# Altium footprint library nccpcblib.PcbLib: 63 footprints (part 2 of 4)
Each footprint in its own frame and in the unit in brackets; x right, y up, seen from the top. Pads: shape width x height; smd on the part's side, far side on the other; paste and mask are expansions set on the pad; w line width, h text height; cw(c..) or ccw(c..) is an arc to the next point about the centre after c.
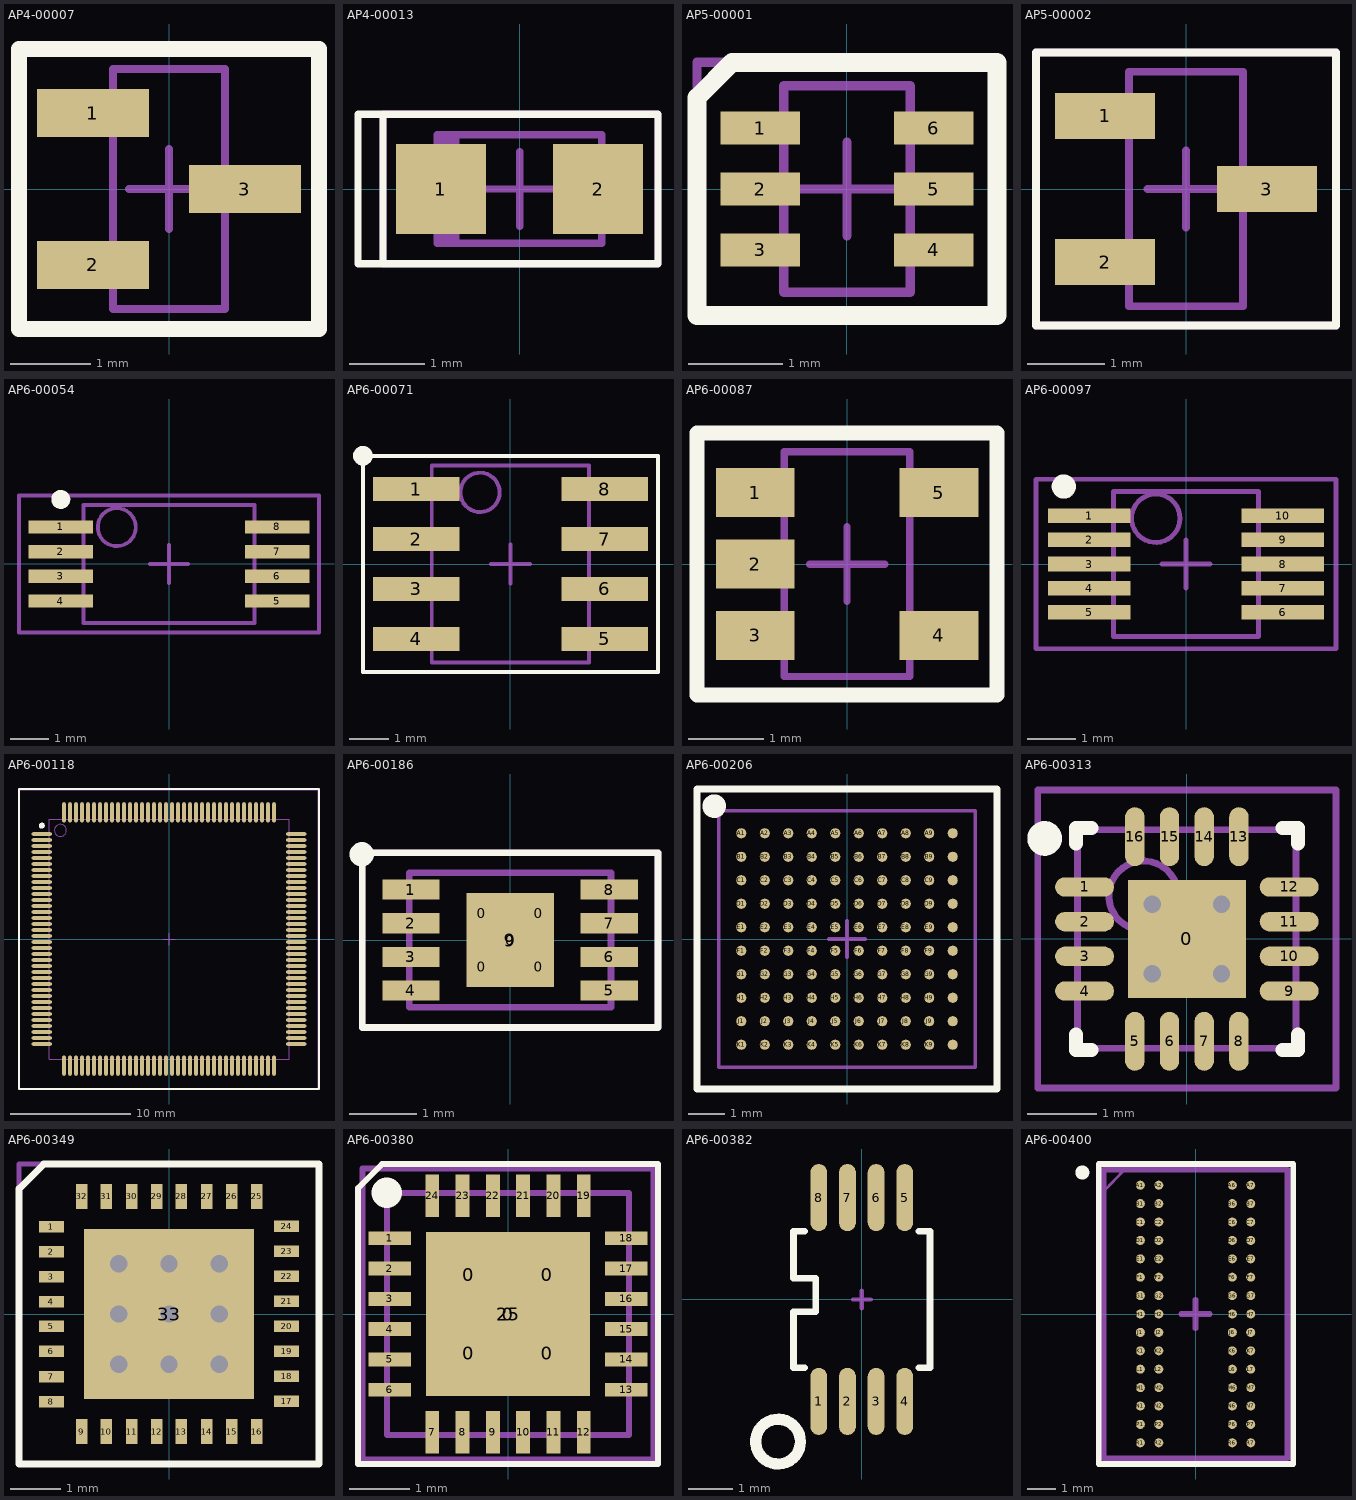
[diagram p1: the footprints below, top view; thin cyan lines are the x and y axes]

## AP4-00007 [mm]
height 1.1
pads (3):
  rect 1.4x0.6 smd: 1(-0.95,0.95) 2(-0.95,-0.95) 3(0.95,0)
Top Overlay:
  lines w0.2: -1.875,-1.75 1.875,-1.75 1.875,1.75 -1.875,1.75 -1.875,-1.75
Mechanical 13:
  lines w0.1: -0.7,-1.5 -0.7,1.5 0.7,1.5 0.7,-1.5 -0.7,-1.5
Mechanical 15:
  lines w0.1: -0.5,0 0.5,0 ; 0,-0.5 0,0.5 ; -1.875,-1.75 1.875,-1.75 1.875,1.75 -1.875,1.75 -1.875,-1.75
3D body: height 1.07, standoff -0.03, extent -1.25,-1.5 1.25,1.5

## AP4-00013 [mm] "0805 diode footprint"
height 1.1
pads (2):
  rect 1.2x1.2 smd: 1(-1.05,0) 2(1.05,0)
Top Overlay:
  lines w0.1: -1.762,1 -2.159,1 -2.159,-1 -1.794,-1 ; -1.794,-1 -1.825,-0.969 -1.825,1 1.85,1 1.85,-1 -1.794,-1
Mechanical 13:
  rectangle: -1.1,-0.725 -0.804,0.725
  lines w0.1: -1.1,-0.725 -1.1,0.725 1.1,0.725 1.1,-0.725 -1.1,-0.725
Mechanical 15:
  lines w0.1: -0.5,0 0.5,0 ; 0,-0.5 0,0.5 ; -1.825,-1 -1.825,1 1.85,1 1.85,-1 -1.825,-1
3D body: height 0.6, standoff 0, extent -0.85,-0.625 0.85,0.625
3D body: height 1.1, standoff 0.6, extent -0.7,-0.625 0.7,0.625
3D body: height 0.61, standoff 0, extent -1,-0.625 -0.85,0.625
3D body: height 0.61, standoff 0, extent 0.85,-0.625 1,0.625
3D body: height 0.61, standoff 0.6, extent -0.7,-0.1 0.7,0.1
3D body: height 0.61, standoff 0.6, extent -0.675,-0.6 -0.525,-0.45
3D body: height 0.61, standoff 0.6, extent -0.675,0.45 -0.525,0.6
3D body: height 0.65, standoff 0.6, extent -0.425,-0.05 -0.325,0.05

## AP5-00001 [mm]
height 1.1
pads (6):
  rect 0.85x0.35 smd: 1(-0.925,0.65) 2(-0.925,0) 3(-0.925,-0.65) 4(0.925,-0.65) 5(0.925,0) 6(0.925,0.65)
Top Overlay:
  lines w0.2: -1.6,-1.35 -1.6,0.975 -1.225,1.35 1.6,1.35 1.6,-1.35 -1.6,-1.35
Mechanical 13:
  lines w0.1: -0.675,-1.1 0.675,-1.1 0.675,1.1 -0.675,1.1 -0.675,-1.1
Mechanical 15:
  lines w0.1: -0.5,0 0.5,0 ; 0,-0.5 0,0.5 ; -1.6,-1.35 1.6,-1.35 1.6,1.35 -1.6,1.35 -1.6,-1.35
3D body: height 0.95, standoff -0.04, extent -1.05,-1 1.05,1

## AP5-00002 [mm] "SOT-23 Package"
height 1.1
pads (3):
  rect 1.3x0.6 smd: 1(-1.05,0.95) 2(-1.05,-0.95) 3(1.05,0)
Top Overlay:
  lines w0.1: -1.95,-1.775 1.95,-1.775 1.95,1.775 -1.95,1.775 -1.95,-1.775
Mechanical 13:
  lines w0.1: -0.74,-1.525 -0.74,1.525 0.74,1.525 0.74,-1.525 -0.74,-1.525
Mechanical 15:
  lines w0.1: -0.5,0 0.5,0 ; 0,-0.5 0,0.5 ; -1.95,-1.775 -1.95,1.775 1.95,1.775 1.95,-1.775 -1.95,-1.775
3D body: height 1, standoff -0.02, extent -1.25,-1.46 1.226,1.46

## AP6-00054 [mm]
height 1.2
pads (8):
  rect 1.7x0.35 smd: 1(-2.85,0.975) 2(-2.85,0.325) 3(-2.85,-0.325) 4(-2.85,-0.975) 5(2.85,-0.975) 6(2.85,-0.325) 7(2.85,0.325) 8(2.85,0.975)
Top Overlay:
  circle w0.25: c-2.85,1.7 r0.125
Mechanical 13:
  circle w0.1: c-1.375,0.97 r0.5
  lines w0.1: -2.25,-1.55 2.25,-1.55 2.25,1.55 -2.25,1.55 -2.25,-1.55
Mechanical 15:
  lines w0.1: -0.5,0 0.5,0 ; 0,-0.5 0,0.5 ; -3.95,-1.8 3.95,-1.8 3.95,1.8 -3.95,1.8 -3.95,-1.8
3D body: height 1.25, standoff 0, extent -3.228,-1.55 3.228,1.55

## AP6-00071 [mm]
height 1.75
pads (8):
  rect 2.2x0.6 smd: 1(-2.4,1.905) 2(-2.4,0.635) 3(-2.4,-0.635) 4(-2.4,-1.905) 5(2.4,-1.905) 6(2.4,-0.635) 7(2.4,0.635) 8(2.4,1.905)
Top Overlay:
  circle w0.25: c-3.75,2.75 r0.125
  lines w0.1: -3.75,-2.75 3.75,-2.75 3.75,2.75 -3.75,2.75 -3.75,-2.75
Mechanical 13:
  circle w0.1: c-0.775,1.82 r0.5
  lines w0.1: -2,-2.5 -2,2.5 2,2.5 2,-2.5 -2,-2.5
Mechanical 15:
  lines w0.1: -0.5,0 0.5,0 ; 0,-0.5 0,0.5 ; -3.75,-2.75 -3.75,2.75 3.75,2.75 3.75,-2.75 -3.75,-2.75
3D body: height 1.75, standoff 0, extent -3,-2.45 3,2.45

## AP6-00087 [mm]
height 1.22
pads (5):
  rect 1.05x0.65 smd: 1(-1.225,0.953) 2(-1.225,0) 3(-1.225,-0.953) 4(1.225,-0.953) 5(1.225,0.953)
Top Overlay:
  lines w0.2: -2,-1.75 -2,1.75 2,1.75 2,-1.75 -2,-1.75
Mechanical 13:
  lines w0.1: -0.835,-1.5 0.835,-1.5 0.835,1.5 -0.835,1.5 -0.835,-1.5
Mechanical 15:
  lines w0.1: -0.5,0 0.5,0 ; 0,-0.5 0,0.5 ; -2,-1.75 2,-1.75 2,1.75 -2,1.75 -2,-1.75
3D body: height 1.3, standoff 0, extent -1.5,-1.5 1.5,1.5

## AP6-00097 [mm]
height 1.1
pads (10):
  rect 1.7x0.3 smd: 1(-2,1) 2(-2,0.5) 3(-2,0) 4(-2,-0.5) 5(-2,-1) 6(2,-1) 7(2,-0.5) 8(2,0) 9(2,0.5) 10(2,1)
Top Overlay:
  circle w0.25: c-2.525,1.6 r0.125
Mechanical 13:
  circle w0.1: c-0.625,0.945 r0.5
  lines w0.1: -1.5,-1.5 1.5,-1.5 1.5,1.5 -1.5,1.5 -1.5,-1.5
Mechanical 15:
  lines w0.1: -0.5,0 0.5,0 ; 0,-0.5 0,0.5 ; -3.1,-1.75 3.1,-1.75 3.1,1.75 -3.1,1.75 -3.1,-1.75
3D body: height 1.15, standoff 0, extent -2.45,-1.5 2.45,1.5

## AP6-00118 [mm]
height 1.6
pads (144):
  oval 1.7x0.3 smd: 1(-10.6,8.75) 2(-10.6,8.25) 3(-10.6,7.75) 4(-10.6,7.25) 5(-10.6,6.75) 6(-10.6,6.25) 7(-10.6,5.75) 8(-10.6,5.25) 9(-10.6,4.75) 10(-10.6,4.25) 11(-10.6,3.75) 12(-10.6,3.25) 13(-10.6,2.75) 14(-10.6,2.25) 15(-10.6,1.75) 16(-10.6,1.25) 17(-10.6,0.75) 18(-10.6,0.25) 19(-10.6,-0.25) 20(-10.6,-0.75) 21(-10.6,-1.25) 22(-10.6,-1.75) 23(-10.6,-2.25) 24(-10.6,-2.75) 25(-10.6,-3.25) 26(-10.6,-3.75) 27(-10.6,-4.25) 28(-10.6,-4.75) 29(-10.6,-5.25) 30(-10.6,-5.75) 31(-10.6,-6.25) 32(-10.6,-6.75) 33(-10.6,-7.25) 34(-10.6,-7.75) 35(-10.6,-8.25) 36(-10.6,-8.75) 73(10.6,-8.75) 74(10.6,-8.25) 75(10.6,-7.75) 76(10.6,-7.25) 77(10.6,-6.75) 78(10.6,-6.25) 79(10.6,-5.75) 80(10.6,-5.25) 81(10.6,-4.75) 82(10.6,-4.25) 83(10.6,-3.75) 84(10.6,-3.25) 85(10.6,-2.75) 86(10.6,-2.25) 87(10.6,-1.75) 88(10.6,-1.25) 89(10.6,-0.75) 90(10.6,-0.25) 91(10.6,0.25) 92(10.6,0.75) 93(10.6,1.25) 94(10.6,1.75) 95(10.6,2.25) 96(10.6,2.75) 97(10.6,3.25) 98(10.6,3.75) 99(10.6,4.25) 100(10.6,4.75) 101(10.6,5.25) 102(10.6,5.75) 103(10.6,6.25) 104(10.6,6.75) 105(10.6,7.25) 106(10.6,7.75) 107(10.6,8.25) 108(10.6,8.75)
  oval 0.3x1.7 smd: 37(-8.75,-10.55) 38(-8.25,-10.55) 39(-7.75,-10.55) 40(-7.25,-10.55) 41(-6.75,-10.55) 42(-6.25,-10.55) 43(-5.75,-10.55) 44(-5.25,-10.55) 45(-4.75,-10.55) 46(-4.25,-10.55) 47(-3.75,-10.55) 48(-3.25,-10.55) 49(-2.75,-10.55) 50(-2.25,-10.55) 51(-1.75,-10.55) 52(-1.25,-10.55) 53(-0.75,-10.55) 54(-0.25,-10.55) 55(0.25,-10.55) 56(0.75,-10.55) 57(1.25,-10.55) 58(1.75,-10.55) 59(2.25,-10.55) 60(2.75,-10.55) 61(3.25,-10.55) 62(3.75,-10.55) 63(4.25,-10.55) 64(4.75,-10.55) 65(5.25,-10.55) 66(5.75,-10.55) 67(6.25,-10.55) 68(6.75,-10.55) 69(7.25,-10.55) 70(7.75,-10.55) 71(8.25,-10.55) 72(8.75,-10.55) 109(8.75,10.55) 110(8.25,10.55) 111(7.75,10.55) 112(7.25,10.55) 113(6.75,10.55) 114(6.25,10.55) 115(5.75,10.55) 116(5.25,10.55) 117(4.75,10.55) 118(4.25,10.55) 119(3.75,10.55) 120(3.25,10.55) 121(2.75,10.55) 122(2.25,10.55) 123(1.75,10.55) 124(1.25,10.55) 125(0.75,10.55) 126(0.25,10.55) 127(-0.25,10.55) 128(-0.75,10.55) 129(-1.25,10.55) 130(-1.75,10.55) 131(-2.25,10.55) 132(-2.75,10.55) 133(-3.25,10.55) 134(-3.75,10.55) 135(-4.25,10.55) 136(-4.75,10.55) 137(-5.25,10.55) 138(-5.75,10.55) 139(-6.25,10.55) 140(-6.75,10.55) 141(-7.25,10.55) 142(-7.75,10.55) 143(-8.25,10.55) 144(-8.75,10.55)
Top Overlay:
  circle w0.25: c-10.6,9.45 r0.125
  lines w0.2: -12.5,-12.5 -12.5,12.5 12.5,12.5 12.5,-12.5 -12.5,-12.5
Mechanical 13:
  circle w0.1: c-9.05,9.05 r0.5
  lines w0.1: -10,-10 -10,10 10,10 10,-10 -10,-10
Mechanical 15:
  lines w0.1: -0.5,0 0.5,0 ; 0,-0.5 0,0.5 ; -12.425,-12.425 -12.425,12.425 12.425,12.425 12.425,-12.425 -12.425,-12.425
3D body: height 1.64, standoff -0.01, extent -11,-11 11,11
3D body: height 1.71, standoff 1.5, extent -1.5,5 1.5,7

## AP6-00186 [mm] "8M2, 8-lead 2.0x3.0 mm Body, 0.50 mm Pitch,  WDFN, Very Very Thin, Dual No Lead Package"
height 0.8
pads (14):
  round 0.264 on Top Paste: 0(-0.425,-0.4) 0(-0.425,0.4) 0(0,0) 0(0.425,-0.4) 0(0.425,0.4)
  rect 0.85x0.3 smd: 1(-1.475,0.75) 2(-1.475,0.25) 3(-1.475,-0.25) 4(-1.475,-0.75) 5(1.475,-0.75) 6(1.475,-0.25) 7(1.475,0.25) 8(1.475,0.75)
  rect 1.3x1.4 smd paste-0.7: 9(0,0)
Top Overlay:
  circle w0.25: c-2.206,1.275 r0.056
  lines w0.1: -2.2,-1.3 2.2,-1.3 2.2,1.3 -2.2,1.3 -2.2,-1.3
Mechanical 13:
  lines w0.1: -1.5,-1 1.5,-1 1.5,1 -1.5,1 -1.5,-1
Mechanical 15:
  lines w0.1: -0.5,0 0.5,0 ; 0,-0.5 0,0.5 ; -2.2,-1.3 2.2,-1.3 2.2,1.3 -2.2,1.3 -2.2,-1.3
3D body: height 0.76, standoff 0.74, extent -1.299,0.6 -1.1,0.8
3D body: height 0.2, standoff 0, extent 1.125,-0.875 1.525,-0.625
3D body: height 0.2, standoff 0, extent 1.125,-0.375 1.525,-0.125
3D body: height 0.2, standoff 0, extent 1.125,0.125 1.525,0.375
3D body: height 0.2, standoff 0, extent 1.125,0.625 1.525,0.875
3D body: height 0.2, standoff 0, extent -1.525,-0.875 -1.125,-0.625
3D body: height 0.2, standoff 0, extent -1.525,-0.375 -1.125,-0.125
3D body: height 0.2, standoff 0, extent -1.525,0.125 -1.125,0.375
3D body: height 0.2, standoff 0, extent -1.525,0.625 -1.125,0.875
3D body: height 0.75, standoff 0.05, extent -1.5,-1 1.5,1

## AP6-00206 [mm] "100 ball (10x10 array) VFBGA. Pitch 0.65 mm. Width: 7 mm. Length: 7mm. Height: 1 mm"
height 1
pads (100):
  round 0.28 smd: A1(-2.925,2.925) A2(-2.275,2.925) A3(-1.625,2.925) A4(-0.975,2.925) A5(-0.325,2.925) A6(0.325,2.925) A7(0.975,2.925) A8(1.625,2.925) A9(2.275,2.925) A10(2.925,2.925) B1(-2.925,2.275) B2(-2.275,2.275) B3(-1.625,2.275) B4(-0.975,2.275) B5(-0.325,2.275) B6(0.325,2.275) B7(0.975,2.275) B8(1.625,2.275) B9(2.275,2.275) B10(2.925,2.275) C1(-2.925,1.625) C2(-2.275,1.625) C3(-1.625,1.625) C4(-0.975,1.625) C5(-0.325,1.625) C6(0.325,1.625) C7(0.975,1.625) C8(1.625,1.625) C9(2.275,1.625) C10(2.925,1.625) D1(-2.925,0.975) D2(-2.275,0.975) D3(-1.625,0.975) D4(-0.975,0.975) D5(-0.325,0.975) D6(0.325,0.975) D7(0.975,0.975) D8(1.625,0.975) D9(2.275,0.975) D10(2.925,0.975) E1(-2.925,0.325) E2(-2.275,0.325) E3(-1.625,0.325) E4(-0.975,0.325) E5(-0.325,0.325) E6(0.325,0.325) E7(0.975,0.325) E8(1.625,0.325) E9(2.275,0.325) E10(2.925,0.325) F1(-2.925,-0.325) F2(-2.275,-0.325) F3(-1.625,-0.325) F4(-0.975,-0.325) F5(-0.325,-0.325) F6(0.325,-0.325) F7(0.975,-0.325) F8(1.625,-0.325) F9(2.275,-0.325) F10(2.925,-0.325) G1(-2.925,-0.975) G2(-2.275,-0.975) G3(-1.625,-0.975) G4(-0.975,-0.975) G5(-0.325,-0.975) G6(0.325,-0.975) G7(0.975,-0.975) G8(1.625,-0.975) G9(2.275,-0.975) G10(2.925,-0.975) H1(-2.925,-1.625) H2(-2.275,-1.625) H3(-1.625,-1.625) H4(-0.975,-1.625) H5(-0.325,-1.625) H6(0.325,-1.625) H7(0.975,-1.625) H8(1.625,-1.625) H9(2.275,-1.625) H10(2.925,-1.625) J1(-2.925,-2.275) J2(-2.275,-2.275) J3(-1.625,-2.275) J4(-0.975,-2.275) J5(-0.325,-2.275) J6(0.325,-2.275) J7(0.975,-2.275) J8(1.625,-2.275) J9(2.275,-2.275) J10(2.925,-2.275) K1(-2.925,-2.925) K2(-2.275,-2.925) K3(-1.625,-2.925) K4(-0.975,-2.925) K5(-0.325,-2.925) K6(0.325,-2.925) K7(0.975,-2.925) K8(1.625,-2.925) K9(2.275,-2.925) K10(2.925,-2.925)
Top Overlay:
  circle w0.4: c-3.675,3.675 r0.125
  lines w0.2: -4.15,-4.15 -4.15,4.15 4.15,4.15 4.15,-4.15 -4.15,-4.15
Mechanical 13:
  lines w0.1: -3.55,-3.55 3.55,-3.55 3.55,3.55 -3.55,3.55 -3.55,-3.55
Mechanical 15:
  lines w0.1: -0.5,0 0.5,0 ; 0,-0.5 0,0.5 ; -4.15,-4.15 -4.15,4.15 4.15,4.15 4.15,-4.15 -4.15,-4.15
3D body: height 1, standoff 0.2, extent -3.5,-3.5 3.5,3.5
3D body: height 0.45, standoff 0, extent -2.501,-3.149 -2.051,-2.699
3D body: height 0.45, standoff 0, extent -2.501,-2.499 -2.051,-2.049
3D body: height 0.45, standoff 0, extent -2.501,-1.849 -2.051,-1.399
3D body: height 0.45, standoff 0, extent -2.501,-1.199 -2.051,-0.749
3D body: height 0.45, standoff 0, extent -2.501,-0.549 -2.051,-0.099
3D body: height 0.45, standoff 0, extent -2.501,0.101 -2.051,0.551
3D body: height 0.45, standoff 0, extent -2.501,0.751 -2.051,1.201
3D body: height 0.45, standoff 0, extent -2.501,1.401 -2.051,1.851
3D body: height 0.45, standoff 0, extent -2.501,2.051 -2.051,2.501
3D body: height 0.45, standoff 0, extent -2.501,2.701 -2.051,3.151
3D body: height 0.45, standoff 0, extent -1.851,-3.149 -1.401,-2.699
3D body: height 0.45, standoff 0, extent -1.851,-2.499 -1.401,-2.049
3D body: height 0.45, standoff 0, extent -1.851,-1.849 -1.401,-1.399
3D body: height 0.45, standoff 0, extent -1.851,-1.199 -1.401,-0.749
3D body: height 0.45, standoff 0, extent -1.851,-0.549 -1.401,-0.099
3D body: height 0.45, standoff 0, extent -1.851,0.101 -1.401,0.551
3D body: height 0.45, standoff 0, extent -1.851,0.751 -1.401,1.201
3D body: height 0.45, standoff 0, extent -1.851,1.401 -1.401,1.851
3D body: height 0.45, standoff 0, extent -1.851,2.051 -1.401,2.501
3D body: height 0.45, standoff 0, extent -1.851,2.701 -1.401,3.151
3D body: height 0.45, standoff 0, extent -1.201,-3.149 -0.751,-2.699
3D body: height 0.45, standoff 0, extent -1.201,-2.499 -0.751,-2.049
3D body: height 0.45, standoff 0, extent -1.201,-1.849 -0.751,-1.399
3D body: height 0.45, standoff 0, extent -1.201,-1.199 -0.751,-0.749
3D body: height 0.45, standoff 0, extent -1.201,-0.549 -0.751,-0.099
3D body: height 0.45, standoff 0, extent -1.201,0.101 -0.751,0.551
3D body: height 0.45, standoff 0, extent -1.201,0.751 -0.751,1.201
3D body: height 0.45, standoff 0, extent -1.201,1.401 -0.751,1.851
3D body: height 0.45, standoff 0, extent -1.201,2.051 -0.751,2.501
3D body: height 0.45, standoff 0, extent -1.201,2.701 -0.751,3.151
3D body: height 0.45, standoff 0, extent -0.551,-3.149 -0.101,-2.699
3D body: height 0.45, standoff 0, extent -0.551,-2.499 -0.101,-2.049
3D body: height 0.45, standoff 0, extent -0.551,-1.849 -0.101,-1.399
3D body: height 0.45, standoff 0, extent -0.551,-1.199 -0.101,-0.749
3D body: height 0.45, standoff 0, extent -0.551,-0.549 -0.101,-0.099
3D body: height 0.45, standoff 0, extent -0.551,0.101 -0.101,0.551
3D body: height 0.45, standoff 0, extent -0.551,0.751 -0.101,1.201
3D body: height 0.45, standoff 0, extent -0.551,1.401 -0.101,1.851
3D body: height 0.45, standoff 0, extent -0.551,2.051 -0.101,2.501
3D body: height 0.45, standoff 0, extent -0.551,2.701 -0.101,3.151
3D body: height 0.45, standoff 0, extent 0.099,-3.149 0.549,-2.699
3D body: height 0.45, standoff 0, extent 0.099,-2.499 0.549,-2.049
3D body: height 0.45, standoff 0, extent 0.099,-1.849 0.549,-1.399
3D body: height 0.45, standoff 0, extent 0.099,-1.199 0.549,-0.749
3D body: height 0.45, standoff 0, extent 0.099,-0.549 0.549,-0.099
3D body: height 0.45, standoff 0, extent 0.099,0.101 0.549,0.551
3D body: height 0.45, standoff 0, extent 0.099,0.751 0.549,1.201
3D body: height 0.45, standoff 0, extent 0.099,1.401 0.549,1.851
3D body: height 0.45, standoff 0, extent 0.099,2.051 0.549,2.501
3D body: height 0.45, standoff 0, extent 0.099,2.701 0.549,3.151
3D body: height 0.45, standoff 0, extent 0.749,-3.149 1.199,-2.699
3D body: height 0.45, standoff 0, extent 0.749,-2.499 1.199,-2.049
3D body: height 0.45, standoff 0, extent 0.749,-1.849 1.199,-1.399
3D body: height 0.45, standoff 0, extent 0.749,-1.199 1.199,-0.749
3D body: height 0.45, standoff 0, extent 0.749,-0.549 1.199,-0.099
3D body: height 0.45, standoff 0, extent 0.749,0.101 1.199,0.551
3D body: height 0.45, standoff 0, extent 0.749,0.751 1.199,1.201
3D body: height 0.45, standoff 0, extent 0.749,1.401 1.199,1.851
3D body: height 0.45, standoff 0, extent 0.749,2.051 1.199,2.501
3D body: height 0.45, standoff 0, extent 0.749,2.701 1.199,3.151
3D body: height 0.45, standoff 0, extent 1.399,-3.149 1.849,-2.699
3D body: height 0.45, standoff 0, extent 1.399,-2.499 1.849,-2.049
3D body: height 0.45, standoff 0, extent 1.399,-1.849 1.849,-1.399
3D body: height 0.45, standoff 0, extent 1.399,-1.199 1.849,-0.749
3D body: height 0.45, standoff 0, extent 1.399,-0.549 1.849,-0.099
3D body: height 0.45, standoff 0, extent 1.399,0.101 1.849,0.551
3D body: height 0.45, standoff 0, extent 1.399,0.751 1.849,1.201
3D body: height 0.45, standoff 0, extent 1.399,1.401 1.849,1.851
3D body: height 0.45, standoff 0, extent 1.399,2.051 1.849,2.501
3D body: height 0.45, standoff 0, extent 1.399,2.701 1.849,3.151
3D body: height 0.45, standoff 0, extent 2.049,-3.149 2.499,-2.699
3D body: height 0.45, standoff 0, extent 2.049,-2.499 2.499,-2.049
3D body: height 0.45, standoff 0, extent 2.049,-1.849 2.499,-1.399
3D body: height 0.45, standoff 0, extent 2.049,-1.199 2.499,-0.749
3D body: height 0.45, standoff 0, extent 2.049,-0.549 2.499,-0.099
3D body: height 0.45, standoff 0, extent 2.049,0.101 2.499,0.551
3D body: height 0.45, standoff 0, extent 2.049,0.751 2.499,1.201
3D body: height 0.45, standoff 0, extent 2.049,1.401 2.499,1.851
3D body: height 0.45, standoff 0, extent 2.049,2.051 2.499,2.501
3D body: height 0.45, standoff 0, extent 2.049,2.701 2.499,3.151
3D body: height 0.45, standoff 0, extent 2.699,-3.149 3.149,-2.699
3D body: height 0.45, standoff 0, extent 2.699,-2.499 3.149,-2.049
3D body: height 0.45, standoff 0, extent 2.699,-1.849 3.149,-1.399
3D body: height 0.45, standoff 0, extent 2.699,-1.199 3.149,-0.749
3D body: height 0.45, standoff 0, extent 2.699,-0.549 3.149,-0.099
3D body: height 0.45, standoff 0, extent 2.699,0.101 3.149,0.551
3D body: height 0.45, standoff 0, extent 2.699,0.751 3.149,1.201
3D body: height 0.45, standoff 0, extent 2.699,1.401 3.149,1.851
3D body: height 0.45, standoff 0, extent 2.699,2.051 3.149,2.501
3D body: height 0.45, standoff 0, extent 2.699,2.701 3.149,3.151
3D body: height 0.45, standoff 0, extent -3.151,-3.149 -2.701,-2.699
3D body: height 0.45, standoff 0, extent -3.151,-2.499 -2.701,-2.049
3D body: height 0.45, standoff 0, extent -3.151,-1.849 -2.701,-1.399
3D body: height 0.45, standoff 0, extent -3.151,-1.199 -2.701,-0.749
3D body: height 0.45, standoff 0, extent -3.151,-0.549 -2.701,-0.099
3D body: height 0.45, standoff 0, extent -3.151,0.101 -2.701,0.551
3D body: height 0.45, standoff 0, extent -3.151,0.751 -2.701,1.201
3D body: height 0.45, standoff 0, extent -3.151,1.401 -2.701,1.851
3D body: height 0.45, standoff 0, extent -3.151,2.051 -2.701,2.501
3D body: height 0.45, standoff 0, extent -3.151,2.701 -2.701,3.151
3D body: height 1.01, standoff 0.9, extent -3.45,3.15 -3.151,3.45

## AP6-00313 [mm] "QFN, 16-Leads, Body 3,2x3,2mm (max), Pitch 0,50mm, IPC Medium Density"
height 0.8
pads (17):
  rect 1.7x1.7 smd paste-1.7: 0(0,0)
  oval 0.85x0.28 smd: 1(-1.475,0.75) 2(-1.475,0.25) 3(-1.475,-0.25) 4(-1.475,-0.75) 9(1.475,-0.75) 10(1.475,-0.25) 11(1.475,0.25) 12(1.475,0.75)
  oval 0.28x0.85 smd: 5(-0.75,-1.475) 6(-0.25,-1.475) 7(0.25,-1.475) 8(0.75,-1.475) 13(0.75,1.475) 14(0.25,1.475) 15(-0.25,1.475) 16(-0.75,1.475)
via 0.5,0.5 diameter 0.55 hole 0.25
via -0.5,0.5 diameter 0.55 hole 0.25
via -0.5,-0.5 diameter 0.55 hole 0.25
via 0.5,-0.5 diameter 0.55 hole 0.25
Top Overlay:
  circle w0.25: c-2.05,1.45 r0.125
  lines w0.2: -1.6,-1.375 -1.6,-1.6 -1.375,-1.6 ; -1.6,1.375 -1.6,1.6 -1.375,1.6 ; 1.375,-1.6 1.6,-1.6 1.6,-1.375 ; 1.375,1.6 1.6,1.6 1.6,1.375
Top Paste:
  rectangle: 0.1,0.1 0.8,0.8
  region: -0.1,0.1 -0.1,0.8 -0.8,0.8 -0.8,0.1
  region: -0.1,-0.1 -0.8,-0.1 -0.8,-0.8 -0.1,-0.8
  region: 0.1,-0.1 0.1,-0.8 0.8,-0.8 0.8,-0.1
Mechanical 13:
  circle w0.1: c-0.625,0.625 r0.5
  lines w0.1: -1.575,-1.575 -1.575,1.575 1.575,1.575 1.575,-1.575 -1.575,-1.575
Mechanical 15:
  lines w0.1: -0.5,0 0.5,0 ; 0,-0.5 0,0.5 ; -2.15,-2.15 -2.15,2.15 2.15,2.15 2.15,-2.15 -2.15,-2.15
3D body: height 0.9, standoff 0, extent -1.501,-1.501 1.501,1.501

## AP6-00349 [mm] "QFN55-32LD-LP-1"
height 0.85
pads (33):
  rect 0.5x0.23 smd: 1(-2.35,1.75) 2(-2.35,1.25) 3(-2.35,0.75) 4(-2.35,0.25) 5(-2.35,-0.25) 6(-2.35,-0.75) 7(-2.35,-1.25) 8(-2.35,-1.75) 17(2.35,-1.75) 18(2.35,-1.25) 19(2.35,-0.75) 20(2.35,-0.25) 21(2.35,0.25) 22(2.35,0.75) 23(2.35,1.25) 24(2.35,1.75)
  rect 0.23x0.5 smd: 9(-1.75,-2.35) 10(-1.25,-2.35) 11(-0.75,-2.35) 12(-0.25,-2.35) 13(0.25,-2.35) 14(0.75,-2.35) 15(1.25,-2.35) 16(1.75,-2.35) 25(1.75,2.35) 26(1.25,2.35) 27(0.75,2.35) 28(0.25,2.35) 29(-0.25,2.35) 30(-0.75,2.35) 31(-1.25,2.35) 32(-1.75,2.35)
  rect 3.4x3.4 smd paste-1.7: 33(0,0)
via 1,0 diameter 0.7 hole 0.35
via -1,0 diameter 0.7 hole 0.35
via 0,0 diameter 0.7 hole 0.35
via 1,-1 diameter 0.7 hole 0.35
via -1,-1 diameter 0.7 hole 0.35
via 1,1 diameter 0.7 hole 0.35
via -1,1 diameter 0.7 hole 0.35
via 0,-1 diameter 0.7 hole 0.35
via 0,1 diameter 0.7 hole 0.35
Top Overlay:
  lines w0.15: -3,-3 -3,2.5 -2.5,3 3,3 3,-3 -3,-3
Top Paste:
  rectangle: 0.565,-1.435 1.435,-0.565
  rectangle: -0.435,-1.435 0.435,-0.565
  rectangle: -1.435,-1.435 -0.565,-0.565
  rectangle: -1.435,-0.435 -0.565,0.435
  rectangle: -1.435,0.565 -0.565,1.435
  rectangle: -0.435,0.565 0.435,1.435
  rectangle: 0.565,0.565 1.435,1.435
  rectangle: 0.565,-0.435 1.435,0.435
  rectangle: -0.435,-0.435 0.435,0.435
Mechanical 15:
  lines w0.1: -0.5,0 0.5,0 ; 0,-0.5 0,0.5 ; -3,-3 3,-3 3,3 -3,3 -3,-3
3D body: height 0.8, standoff 0, extent -2.51,-2.51 2.51,2.51

## AP6-00380 [mm] "QFN24, 4x4mm, 0.5 pitch"
height 0.9
pads (30):
  round 0.6 on Top Paste: 0(-0.65,-0.65) 0(-0.65,0.65) 0(0,0) 0(0.65,-0.65) 0(0.65,0.65)
  rect 0.7x0.23 smd mask+0.05: 1(-1.95,1.25) 2(-1.95,0.75) 3(-1.95,0.25) 4(-1.95,-0.25) 5(-1.95,-0.75) 6(-1.95,-1.25) 13(1.95,-1.25) 14(1.95,-0.75) 15(1.95,-0.25) 16(1.95,0.25) 17(1.95,0.75) 18(1.95,1.25)
  rect 0.23x0.7 smd mask+0.05: 7(-1.25,-1.95) 8(-0.75,-1.95) 9(-0.25,-1.95) 10(0.25,-1.95) 11(0.75,-1.95) 12(1.25,-1.95) 19(1.25,1.95) 20(0.75,1.95) 21(0.25,1.95) 22(-0.25,1.95) 23(-0.75,1.95) 24(-1.25,1.95)
  rect 2.7x2.7 smd paste-2 mask+0.05: 25(0,0)
Top Overlay:
  circle w0.5: c-2,2 r0
  lines w0.1: -2.475,-2.475 2.475,-2.475 2.475,2.475 -2.075,2.475 -2.475,2.075 -2.475,-2.475
Mechanical 13:
  lines w0.1: -2,-2 2,-2 2,2 -2,2 -2,-2
Mechanical 15:
  lines w0.1: -0.5,0 0.5,0 ; 0,-0.5 0,0.5 ; -2.4,-2.4 -2.4,2.4 2.4,2.4 2.4,-2.4 -2.4,-2.4
3D body: height 1, standoff 0, extent -2,-2 2,2

## AP6-00382 [mil] "VSSOP"
height 43.31
pads (8):
  oval 15x60 smd: 1(-38.39,-91.02) 2(-12.8,-91.02) 3(12.8,-91.02) 4(38.39,-91.02) 5(38.39,91.02) 6(12.8,91.02) 7(-12.8,91.02) 8(-38.39,91.02)
Top Overlay:
  circle w10: c-74.8,-126.97 r20
  lines w6: -51.18,-61.02 -61.02,-61.02 -61.02,-11.02 -41.02,-11.02 -41.02,18.98 -61.02,18.98 -61.02,61.02 -51.18,61.02 ; 51.18,-61.02 61.02,-61.02 61.02,61.02 51.18,61.02
Mechanical 15:
  lines w3.94: -7.87,0 7.87,0 ; 0,-7.87 0,7.87
3D body: height 37.12, standoff -0.88, extent -59.2,-96.18 58.8,96.82

## AP6-00400 [mm] "FBGA60"
pads (60):
  round 0.32 smd mask+0.075: A1(-1.95,4.55) A2(-1.3,4.55) A6(1.3,4.55) A7(1.95,4.55) B1(-1.95,3.9) B2(-1.3,3.9) B6(1.3,3.9) B7(1.95,3.9) C1(-1.95,3.25) C2(-1.3,3.25) C6(1.3,3.25) C7(1.95,3.25) D1(-1.95,2.6) D2(-1.3,2.6) D6(1.3,2.6) D7(1.95,2.6) E1(-1.95,1.95) E2(-1.3,1.95) E6(1.3,1.95) E7(1.95,1.95) F1(-1.95,1.3) F2(-1.3,1.3) F6(1.3,1.3) F7(1.95,1.3) G1(-1.95,0.65) G2(-1.3,0.65) G6(1.3,0.65) G7(1.95,0.65) H1(-1.95,0) H2(-1.3,0) H6(1.3,0) H7(1.95,0) J1(-1.95,-0.65) J2(-1.3,-0.65) J6(1.3,-0.65) J7(1.95,-0.65) K1(-1.95,-1.3) K2(-1.3,-1.3) K6(1.3,-1.3) K7(1.95,-1.3) L1(-1.95,-1.95) L2(-1.3,-1.95) L6(1.3,-1.95) L7(1.95,-1.95) M1(-1.95,-2.6) M2(-1.3,-2.6) M6(1.3,-2.6) M7(1.95,-2.6) N1(-1.95,-3.25) N2(-1.3,-3.25) N6(1.3,-3.25) N7(1.95,-3.25) P1(-1.95,-3.9) P2(-1.3,-3.9) P6(1.3,-3.9) P7(1.95,-3.9) R1(-1.95,-4.55) R2(-1.3,-4.55) R6(1.3,-4.55) R7(1.95,-4.55)
Top Overlay:
  circle w0.25: c-4,5 r0.125
  lines w0.2: -3.425,-5.3 -3.425,5.3 3.45,5.3 3.45,-5.3 -3.425,-5.3
Mechanical 13:
  lines w0.1: -3.25,4.325 -2.5,5.1 ; -3.25,-5.1 3.25,-5.1 3.25,5.1 -3.25,5.1 -3.25,-5.1
Mechanical 15:
  lines w0.2: -0.5,0 0.5,0 ; 0,-0.5 0,0.5 ; -3.25,-5.1 3.25,-5.1 3.25,5.1 -3.25,5.1 -3.25,-5.1
3D body: height 1.2, standoff 0.28, extent -3.25,-5.1 3.25,5.1